# Altium schematic symbol library 724452_RPL-HX_Mobile_AEP_Rev0p91_Library.SchLib: 162 symbols (part 5 of 5)
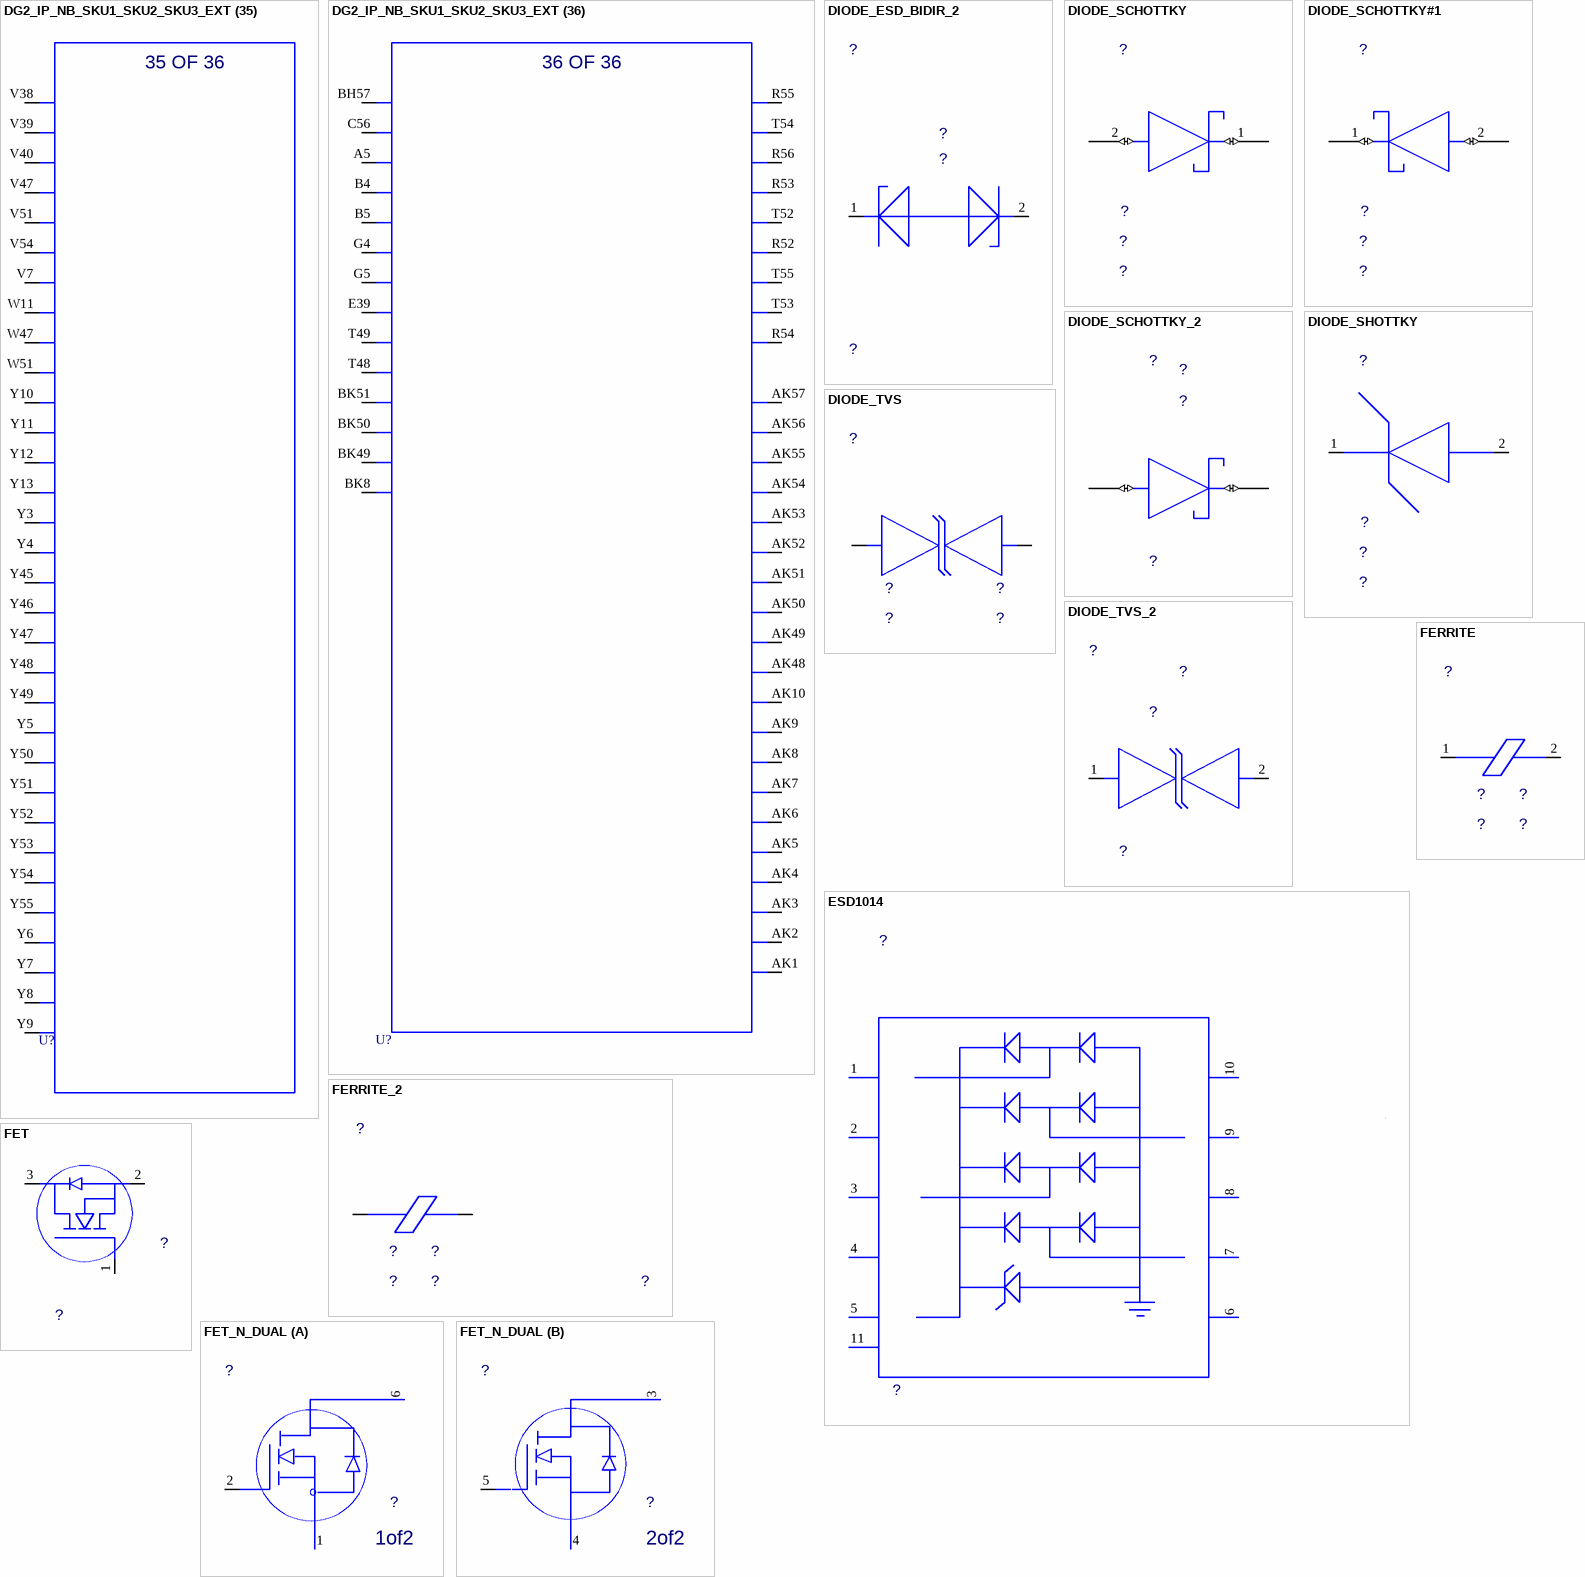
[diagram p47: symbols DG2_IP_NB_SKU1_SKU2_SKU3_EXT to FET_N_DUAL]

## DG2_IP_NB_SKU1_SKU2_SKU3_EXT (continued)
part 33 pins: D2 VSS_193 (io), D4 VSS_208 (io), D6 VSS_225 (io), D7 VSS_226 (io), D8 VSS_227 (io), D9 VSS_228 (io), D10 VSS_183 (io), D11 VSS_184 (io), D12 VSS_185 (io), D13 VSS_186 (io), D14 VSS_187 (io), D15 VSS_188 (io), D16 VSS_189 (io), D17 VSS_190 (io), D18 VSS_191 (io), D19 VSS_192 (io), D20 VSS_194 (io), D21 VSS_195 (io), D22 VSS_196 (io), D23 VSS_197 (io), D25 VSS_198 (io), D27 VSS_199 (io), D28 VSS_200 (io), D29 VSS_201 (io), D30 VSS_202 (io), D31 VSS_203 (io), D32 VSS_204 (io), D33 VSS_205 (io), D37 VSS_206 (io), D39 VSS_207 (io), D41 VSS_209 (io), D43 VSS_210 (io), D44 VSS_211 (io), D45 VSS_212 (io), D46 VSS_213 (io), D47 VSS_214 (io), D48 VSS_215 (io), D49 VSS_216 (io), D50 VSS_217 (io), D51 VSS_218 (io), D52 VSS_219 (io), D53 VSS_220 (io), D54 VSS_221 (io), D55 VSS_222 (io), D56 VSS_223 (io), D57 VSS_224 (io), E6 VSS_250 (io), E8 VSS_251 (io), E10 VSS_229 (io), E12 VSS_230 (io), E14 VSS_231 (io), E16 VSS_232 (io), E18 VSS_233 (io), E20 VSS_234 (io), E22 VSS_235 (io), E23 VSS_236 (io), E24 VSS_237 (io), E25 VSS_238 (io), E26 VSS_239 (io), E27 VSS_240 (io), E29 VSS_241 (io), E43 VSS_242 (io), E45 VSS_243 (io), E47 VSS_244 (io), E49 VSS_245 (io), E50 VSS_246 (io), E53 VSS_247 (io), E54 VSS_248 (io), E57 VSS_249 (io), F2 VSS_252 (io), F4 VSS_262 (io), F6 VSS_269 (io), F23 VSS_253 (io), F25 VSS_254 (io), F27 VSS_255 (io), F29 VSS_256 (io), F30 VSS_257 (io), F32 VSS_258 (io), F34 VSS_259 (io), F36 VSS_260 (io), F38 VSS_261 (io), F40 VSS_263 (io), F43 VSS_264 (io), F50 VSS_265 (io), F51 VSS_266 (io), F54 VSS_267 (io), F55 VSS_268 (io), G6 VSS_292 (io), G7 VSS_293 (io), G9 VSS_294 (io), G11 VSS_270 (io), G13 VSS_271 (io), G15 VSS_272 (io), G17 VSS_273 (io), G19 VSS_274 (io), G21 VSS_275 (io), G23 VSS_276 (io), G25 VSS_277 (io), G27 VSS_278 (io), G28 VSS_279 (io), G29 VSS_280 (io), G31 VSS_281 (io), G33 VSS_282 (io), G37 VSS_283 (io), G43 VSS_284 (io), G44 VSS_285 (io), G46 VSS_286 (io), G48 VSS_287 (io), G50 VSS_288 (io), G53 VSS_289 (io), G54 VSS_290 (io), G57 VSS_291 (io), H2 VSS_305 (io), H3 VSS_312 (io), H4 VSS_313 (io), H5 VSS_323 (io), H6 VSS_328 (io), H7 VSS_329 (io), H8 VSS_330 (io), H9 VSS_331 (io), H10 VSS_295 (io), H11 VSS_296 (io), H12 VSS_297 (io), H13 VSS_298 (io), H14 VSS_299 (io), H15 VSS_300 (io), H16 VSS_301 (io), H17 VSS_302 (io), H18 VSS_303 (io), H19 VSS_304 (io), H20 VSS_306 (io), H21 VSS_307 (io), H22 VSS_308 (io), H23 VSS_309 (io), H26 VSS_310 (io), H29 VSS_311 (io), H41 VSS_314 (io), H42 VSS_315 (io), H43 VSS_316 (io), H44 VSS_317 (io), H45 VSS_318 (io), H46 VSS_319 (io), H47 VSS_320 (io), H48 VSS_321 (io), H49 VSS_322 (io), H50 VSS_324 (io), H51 VSS_325 (io), H54 VSS_326 (io), H55 VSS_327 (io), J15 VSS_332 (io)
part 34 pins: J16 VSS_33 (io), J24 VSS_34 (io), J25 VSS_35 (io), J26 VSS_36 (io), J27 VSS_37 (io), J28 VSS_38 (io), J29 VSS_39 (io), J30 VSS_40 (io), J31 VSS_41 (io), J32 VSS_42 (io), J33 VSS_43 (io), J34 VSS_44 (io), J35 VSS_45 (io), J36 VSS_46 (io), J37 VSS_47 (io), J38 VSS_48 (io), J39 VSS_49 (io), J40 VSS_50 (io), J41 VSS_51 (io), J50 VSS_52 (io), J53 VSS_53 (io), J54 VSS_54 (io), J57 VSS_55 (io), K16 VSS_56 (io), K17 VSS_57 (io), K50 VSS_58 (io), K51 VSS_59 (io), K54 VSS_60 (io), K55 VSS_61 (io), L17 VSS_62 (io), L18 VSS_63 (io), L19 VSS_64 (io), L51 VSS_65 (io), L52 VSS_66 (io), L53 VSS_67 (io), L54 VSS_68 (io), L55 VSS_69 (io), L56 VSS_70 (io), L57 VSS_71 (io), M19 VSS_72 (io), M20 VSS_73 (io), M21 VSS_74 (io), M22 VSS_75 (io), M23 VSS_76 (io), M24 VSS_77 (io), M25 VSS_78 (io), M26 VSS_79 (io), M27 VSS_80 (io), M28 VSS_81 (io), M29 VSS_82 (io), M30 VSS_83 (io), M31 VSS_84 (io), M32 VSS_85 (io), M33 VSS_86 (io), M34 VSS_87 (io), M35 VSS_88 (io), M36 VSS_89 (io), M37 VSS_90 (io), M38 VSS_91 (io), M39 VSS_92 (io), M40 VSS_93 (io), M41 VSS_94 (io), M42 VSS_95 (io), M43 VSS_96 (io), M44 VSS_97 (io), M45 VSS_98 (io), M46 VSS_99 (io), M47 VSS_100 (io), N47 VSS_101 (io), P47 VSS_102 (io), P48 VSS_103 (io), P49 VSS_104 (io), P50 VSS_105 (io), P51 VSS_106 (io), P52 VSS_107 (io), P53 VSS_108 (io), P54 VSS_109 (io), P55 VSS_110 (io), P56 VSS_111 (io), P57 VSS_112 (io), R16 VSS_113 (io), R17 VSS_114 (io), R18 VSS_115 (io), R19 VSS_116 (io), R20 VSS_117 (io), R21 VSS_118 (io), R22 VSS_119 (io), R23 VSS_120 (io), R24 VSS_121 (io), R25 VSS_122 (io), R26 VSS_123 (io), R27 VSS_124 (io), R28 VSS_125 (io), R29 VSS_126 (io), R30 VSS_127 (io), R31 VSS_128 (io), R32 VSS_129 (io), R33 VSS_130 (io), R34 VSS_131 (io), R35 VSS_132 (io), R36 VSS_133 (io), R37 VSS_134 (io), R38 VSS_135 (io), R39 VSS_136 (io), R40 VSS_137 (io), R41 VSS_138 (io), R42 VSS_139 (io), R47 VSS_140 (io), T47 VSS_141 (io), T56 VSS_142 (io), U2 VSS_145 (io), U3 VSS_146 (io), U4 VSS_147 (io), U5 VSS_151 (io), U6 VSS_158 (io), U7 VSS_159 (io), U8 VSS_160 (io), U9 VSS_161 (io), U10 VSS_143 (io), U11 VSS_144 (io), U47 VSS_148 (io), U48 VSS_149 (io), U49 VSS_150 (io), U50 VSS_152 (io), U51 VSS_153 (io), U52 VSS_154 (io), U53 VSS_155 (io), U54 VSS_156 (io), U55 VSS_157 (io), V11 VSS_162 (io), V18 VSS_163 (io), V19 VSS_164 (io), V20 VSS_165 (io), V21 VSS_166 (io), V22 VSS_167 (io), V23 VSS_168 (io), V24 VSS_169 (io), V25 VSS_170 (io), V26 VSS_171 (io), V27 VSS_172 (io), V28 VSS_173 (io), V29 VSS_174 (io), V30 VSS_175 (io), V31 VSS_176 (io), V32 VSS_177 (io), V33 VSS_178 (io), V34 VSS_179 (io), V35 VSS_180 (io), V36 VSS_181 (io), V37 VSS_182 (io)
part 35 pins: V7 VSS_7 (io), V38 VSS_1 (io), V39 VSS_2 (io), V40 VSS_3 (io), V47 VSS_4 (io), V51 VSS_5 (io), V54 VSS_6 (io), W11 VSS_8 (io), W47 VSS_9 (io), W51 VSS_10 (io), Y3 VSS_15 (io), Y4 VSS_16 (io), Y5 VSS_22 (io), Y6 VSS_29 (io), Y7 VSS_30 (io), Y8 VSS_31 (io), Y9 VSS_32 (io), Y10 VSS_11 (io), Y11 VSS_12 (io), Y12 VSS_13 (io), Y13 VSS_14 (io), Y45 VSS_17 (io), Y46 VSS_18 (io), Y47 VSS_19 (io), Y48 VSS_20 (io), Y49 VSS_21 (io), Y50 VSS_23 (io), Y51 VSS_24 (io), Y52 VSS_25 (io), Y53 VSS_26 (io), Y54 VSS_27 (io), Y55 VSS_28 (io)
part 36 pins: A5 RSVD_2 (io), AK1 RSVD_22 (io), AK2 RSVD_21 (io), AK3 RSVD_20 (io), AK4 RSVD_19 (io), AK5 RSVD_18 (io), AK6 RSVD_17 (io), AK7 RSVD_16 (io), AK8 RSVD_15 (io), AK9 RSVD_14 (io), AK10 RSVD_13 (io), AK48 RSVD_12 (io), AK49 RSVD_11 (io), AK50 RSVD_10 (io), AK51 RSVD_9 (io), AK52 RSVD_8 (io), AK53 RSVD_7 (io), AK54 RSVD_6 (io), AK55 RSVD_5 (io), AK56 RSVD_4 (io), AK57 RSVD_3 (io), B4 RSVD_TP_1 (io), B5 RSVD_TP_2 (io), BH57 NCTF (io), BK8 RSVD_TP_11 (io), BK49 RSVD_TP_10 (io), BK50 RSVD_TP_9 (io), BK51 RSVD_TP_8 (io), C56 RSVD_1 (io), E39 RSVD_TP_5 (io), G4 RSVD_TP_3 (io), G5 RSVD_TP_4 (io), R52 RSVD_TP_17 (io), R53 RSVD_TP_15 (io), R54 RSVD_TP_20 (io), R55 RSVD_TP_12 (io), R56 RSVD_TP_14 (io), T48 RSVD_TP_7 (io), T49 RSVD_TP_6 (io), T52 RSVD_TP_16 (io), T53 RSVD_TP_19 (io), T54 RSVD_TP_13 (io), T55 RSVD_TP_18 (io)
part A text: 1 OF 36
part B text: 2 OF 36
part C text: 3 OF 36
part D text: 4 OF 36
part E text: 5 OF 36
part F text: 6 OF 36
part G text: 7 OF 36
part H text: 8 OF 36
part I text: 9 OF 36
part J text: 10  OF 36
part K text: 11 OF 36
part L text: 12  OF 36
part M text: 13 OF 36
part N text: 14 OF 36
part O text: 15 OF 36
part P text: 16 OF 36
part Q text: 17 OF 36
part R text: 18 OF 36
part S text: 19 OF 36
part T text: 20 OF 36
part U text: 21 OF 36
part V text: 22 OF 36
part W text: 23 OF 36
part X text: 24 OF 36
part Y text: 25 OF 36
part Z text: 26 OF 36
part 27 text: 27 OF 36
part 28 text: 28 OF 36
part 29 text: 29 OF 36
part 30 text: 30 OF 36
part 31 text: 31 OF 36
part 32 text: 32 OF 36
part 33 text: 33 OF 36
part 34 text: 34 OF 36
part 35 text: 35 OF 36
part 36 text: 36 OF 36

## DIODE_ESD_BIDIR_2
designator ?, comment ?
BOM_USE: STUFF; CDS_LMAN_SYM_OUTLINE: -150,150,150,-150; ROOM: NONE; OriginalSymbolOrigin: (-125,50); CURRENT: ?; FP_TECH: ?; IP: ?; MATERIAL: ?; PACK_TYPE: ?; PART_NUMBER: ?; VARIANT: ?
pins: 1 K1 (io), 2 K2 (io)

## DIODE_SCHOTTKY
designator ?, comment ?
CDS_LMAN_SYM_OUTLINE: -50,100,50,-100; OriginalSymbolOrigin: (-75,50); CURRENT: ?; MATERIAL: ?; PACK_TYPE: ?; PART_NUMBER: ?
pins: 1 CATHODE (io), 2 ANODE (io)

## DIODE_SCHOTTKY#1
designator ?, comment ?
CDS_LMAN_SYM_OUTLINE: -50,100,50,-100; OriginalSymbolOrigin: (-75,50); CURRENT: ?; MATERIAL: ?; PACK_TYPE: ?; PART_NUMBER: ?
pins: 1 CATHODE (io), 2 ANODE (io)

## DIODE_SCHOTTKY_2
designator ?, comment ?
BOM_USE: STUFF; CDS_LMAN_SYM_OUTLINE: -50,100,50,-100; ROOM: NONE; OriginalSymbolOrigin: (-75,50); CURRENT: ?; FP_TECH: ?; IP: ?; MATERIAL: ?; PACK_TYPE: ?; PART_NUMBER: ?; VARIANT: ?
pins: 1 CATHODE (io), 2 ANODE (io)

## DIODE_SHOTTKY
designator ?, comment ?
CDS_LMAN_SYM_OUTLINE: -50,100,50,-100; OriginalSymbolOrigin: (-125,100); CURRENT: ?; MATERIAL: ?; PACK_TYPE: ?; PART_NUMBER: ?
pins: 1 CATHODE (io), 2 ANODE (io)

## DIODE_TVS
designator ?, comment ?
CDS_LMAN_SYM_OUTLINE: -100,50,100,-50; OriginalSymbolOrigin: (-125,50); CURRENT: ?; MATERIAL: ?; PACK_TYPE: ?; PART_NUMBER: ?
pins: 1 A1 (io), 2 A2 (io)

## DIODE_TVS_2
designator ?, comment ?
BOM_USE: STUFF; CDS_LMAN_SYM_OUTLINE: -100,50,100,-50; ROOM: NONE; OriginalSymbolOrigin: (-125,50); CURRENT: ?; FP_TECH: ?; IP: ?; MATERIAL: ?; PACK_TYPE: ?; PART_NUMBER: ?; VARIANT: ?
pins: 1 A1 (io), 2 A2 (io)

## ESD1014
designator ?  (value not drawn)
CDS_LMAN_SYM_OUTLINE: -300,350,250,-250; OriginalSymbolOrigin: (-350,350); MATERIAL: ?; PACK_TYPE: ?; PART_NUMBER: ?
pins: 1 (io), 2 (io), 3 (io), 4 (io), 5 (io), 6 (io), 7 (io), 8 (io), 9 (io), 10 (io), 11 (io)

## FERRITE
designator ?, comment ?
OriginalSymbolOrigin: (-75,50); CURRENT: ?; MATERIAL: ?; PACK_TYPE: ?; PART_NUMBER: ?; TOLERANCE: ?
pins: 1 A (io), 2 B (io)

## FERRITE_2
designator ?, comment ?
BOM_USE: STUFF; CDS_LMAN_SYM_OUTLINE: -50,50,50,-50; ROOM: NONE; OriginalSymbolOrigin: (-75,50); CURRENT: ?; FP_TECH: ?; IP: ?; MATERIAL: ?; PACK_TYPE: ?; PART_NUMBER: ?; TOLERANCE: ?; VARIANT: ?
pins: 1 A (io), 2 B (io)

## FET
designator ?  (value not drawn)
CDS_LMAN_SYM_OUTLINE: -100,100,100,-100; OriginalSymbolOrigin: (-75,100); MATERIAL: ?; PACK_TYPE: ?; PART_NUMBER: ?
pins: 1 G (io), 2 S (io), 3 D (io)

## FET_N_DUAL
designator ?  (value not drawn)
CDS_LMAN_SYM_OUTLINE: -100,100,100,-100; OriginalSymbolOrigin: (-125,100); MATERIAL: ?; PACK_TYPE: ?; PART_NUMBER: ?
part A pins: 1 S1 (in), 2 G1 (io), 6 D1 (io)
part B pins: 3 D2 (io), 4 S2 (io), 5 G2 (io)
part A text: 1of2
part B text: 2of2

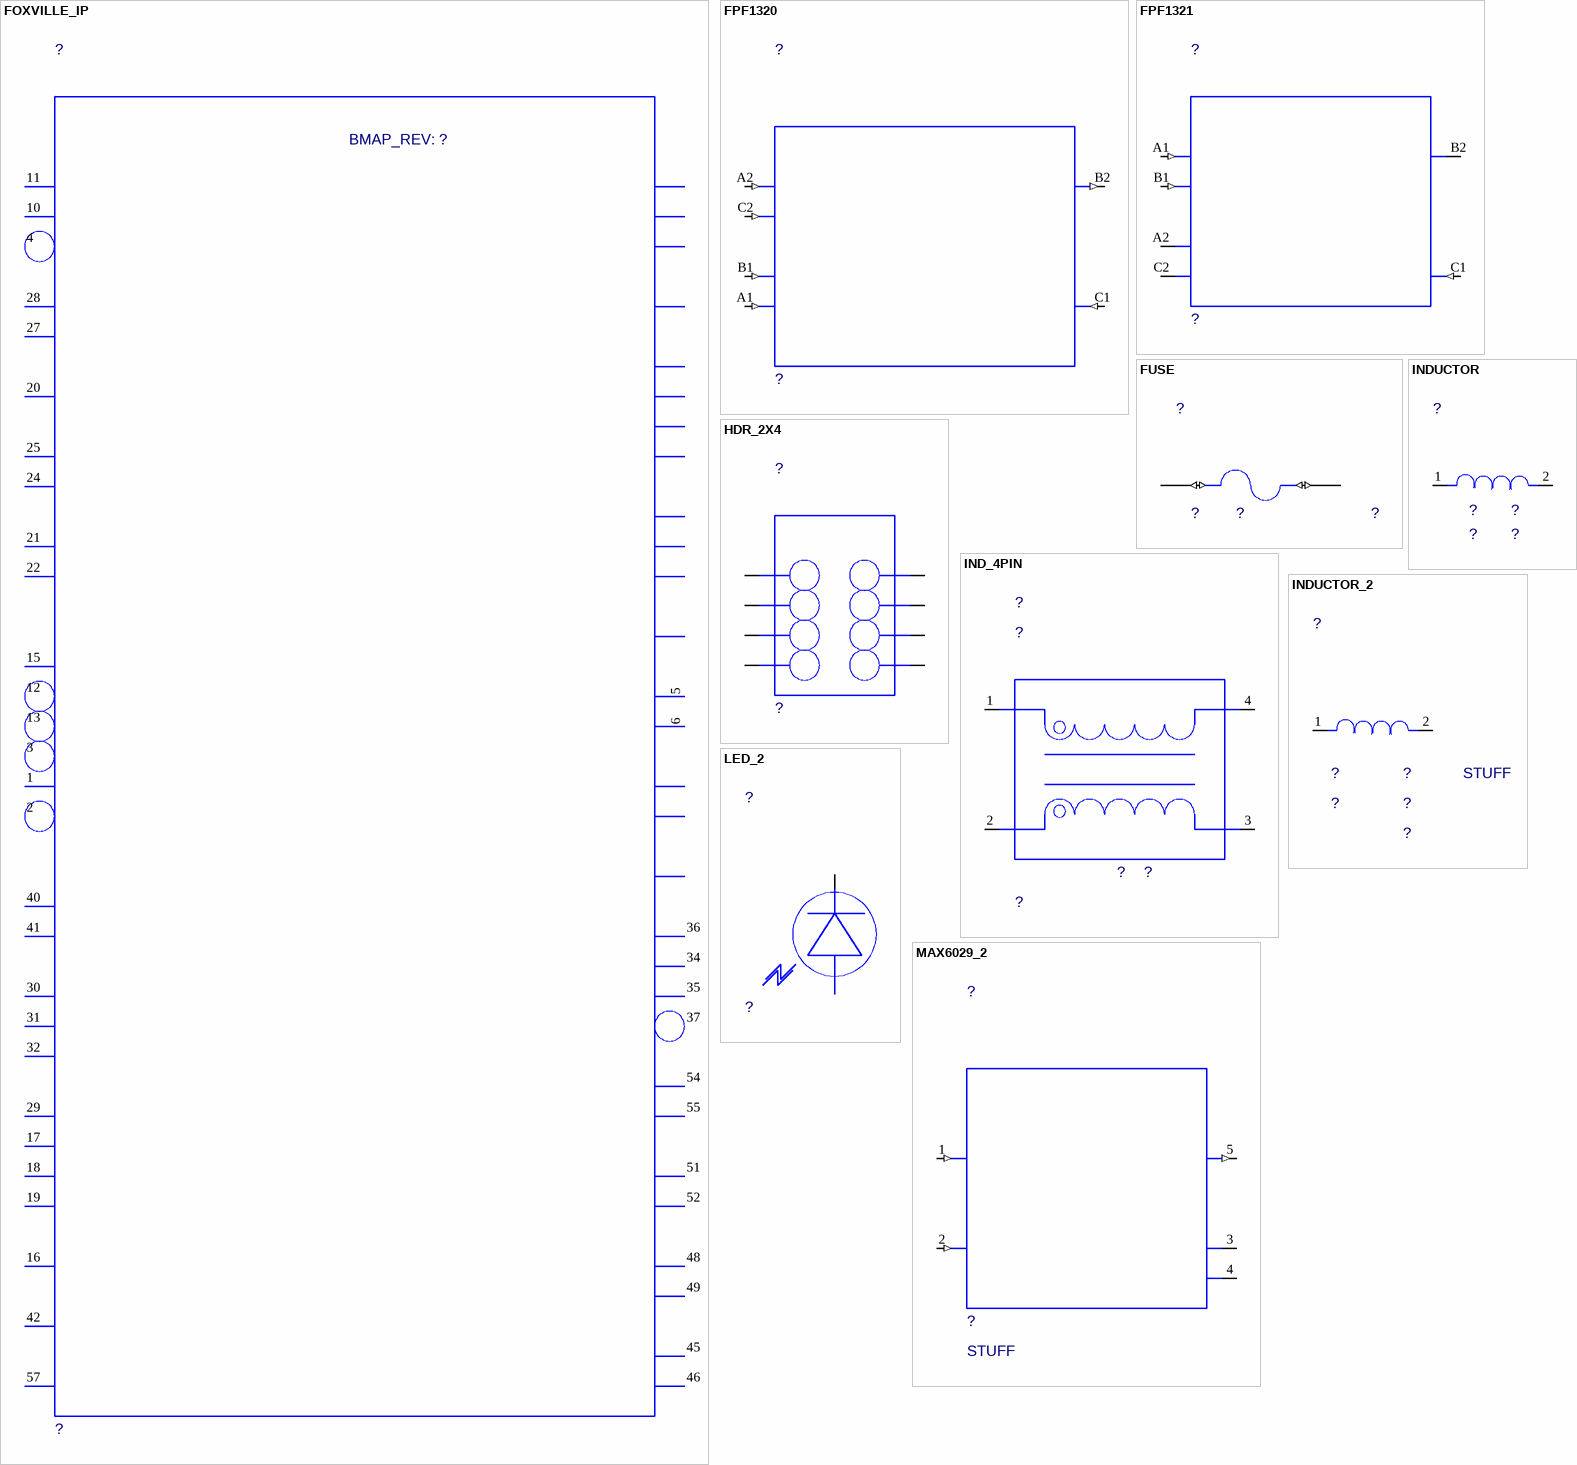
[diagram p39: symbols FOXVILLE_IP to MAX6029_2]

## FOXVILLE_IP
designator ?  (value not drawn)
CDS_LMAN_SYM_OUTLINE: -500,1100,500,-1100; OriginalSymbolOrigin: (-550,1100); BMAP_REV: ?; MATERIAL: ?; PACK_TYPE: ?; PART_NUMBER: ?
pins: 1 LAN_PWR_GOOD (in), 2 LAN_DISABLE_N (in), 3 PE_CLKREQ_N (io), 4 ULP_WAKE_N (io), 5 P0P9V_CTR_1 (out), 6 P0P9V_CTR_2 (out), 7 P3P3V_DC (power) hidden to P3P3V_DC, 8 RESERVED (power) hidden to RESERVED, 9 P0P9V_CORE_1 (power) hidden to P0P9V_CORE_1, 10 SMB_DATA (io), 11 SMB_CLK (io), 12 PE_WAKE_N (io), 13 PE_RST_N (in), 14 P3P3V_PAD_1 (power) hidden to P3P3V_PAD_1, 15 SDP0 (out), 16 JTAG_RST (in), 17 JTAG_TMS_SDP2 (in), 18 JTAG_TDO_ MDI_LANE_SWAP (out), 19 JTAG_TDI_SDP1 (in), 20 RBIAS (io), 21 PE_CLK_P (in), 22 PE_CLK_M (in), 23 P3P3V_VPH (power) hidden to P3P3V_VPH, 24 PE_TX_M (out), 25 PE_TX_P (out), 26 P0P9V_VP (power) hidden to P0P9V_VP, 27 PE_RX_M (in), 28 PE_RX_P (in), 29 JTAG_CLK (in), 30 LED2 (out), 31 LED1 (out), 32 LED0 (out), 33 P3P3V_PAD_2 (power) hidden to P3P3V_PAD_2, 34 SPI_DOUT (out), 35 SPI_CLK (out), 36 SPI_DIN_AUX_PWR (in), 37 SPI_CS_N (out), 38 P0P9V_CORE_2 (power) hidden to P0P9V_CORE_2, 39 P3P3V_XO (power) hidden to P3P3V_XO, 40 XTAL_OUT (out), 41 XTAL_IN (in), 42 PHY_CAL (io), 43 P3P3V_CDB (power) hidden to P3P3V_CDB, 44 P0P9V_A_1 (power) hidden to P0P9V_A_1, 45 MDI_A_P (io), 46 MDI_A_M (io), 47 P3P3V_A_1 (power) hidden to P3P3V_A_1, 48 MDI_B_P (io), 49 MDI_B_M (io), 50 P0P9V_A_2 (power) hidden to P0P9V_A_2, 51 MDI_C_P (io), 52 MDI_C_M (io), 53 P3P3V_A_2 (power) hidden to P3P3V_A_2, 54 MDI_D_P (io), 55 MDI_D_M (io), 56 P0P9V_A_3 (power) hidden to P0P9V_A_3, 57 THPAD (in)

## FPF1320
designator ?  (value not drawn)
CDS_LMAN_SYM_OUTLINE: -250,200,250,-200; ROOM: NONE; OriginalSymbolOrigin: (-275,200); FP_TECH: ?; IP: ?; MATERIAL: ?; PACK_TYPE: ?; PART_NUMBER: ?; VARIANT: ?
pins: A1 EN (in), A2 VINA (in), B1 SEL (in), B2 VOUT (out), C1 GND (in), C2 VINB (in)

## FPF1321
designator ?  (value not drawn)
CDS_LMAN_SYM_OUTLINE: -200,200,200,-150; OriginalSymbolOrigin: (-225,200); MATERIAL: ?; PACK_TYPE: ?; PART_NUMBER: ?
pins: A1 EN (in), A2 VIN_A (power), B1 SEL (in), B2 VOUT (power), C1 GND (in), C2 VIN_B (power)

## FUSE
designator ?  (value not drawn)
CDS_LMAN_SYM_OUTLINE: -50,25,50,-25; OriginalSymbolOrigin: (-75,25); CURRENT: ?; MATERIAL: ?; PACK_TYPE: ?; PART_NUMBER: ?; VOLTAGE: ?
pins: 1 A (io), 2 B (io)

## HDR_2X4
designator ?  (value not drawn)
CDS_LMAN_SYM_OUTLINE: -100,150,100,-150; OriginalSymbolOrigin: (-125,150); FP_TECH: ?; IP: ?; MATERIAL: ?; PACK_TYPE: ?; PART_NUMBER: ?
pins: 1 IO1 (io), 2 IO2 (io), 3 IO3 (io), 4 IO4 (io), 5 IO5 (io), 6 IO6 (io), 7 IO7 (io), 8 IO8 (io)

## IND_4PIN
designator ?, comment ?
CDS_LMAN_SYM_OUTLINE: -200,150,150,-150; OriginalSymbolOrigin: (-225,150); CURRENT: ?; MATERIAL: ?; PACK_TYPE: ?; PART_NUMBER: ?; TOLERANCE: ?
pins: 1 IN_1 (io), 2 OUT_2 (io), 3 IN_2 (io), 4 OUT_1 (io)

## INDUCTOR
designator ?, comment ?
CDS_LMAN_SYM_OUTLINE: -75,25,75,-25; OriginalSymbolOrigin: (-75,25); CURRENT: ?; MATERIAL: ?; PACK_TYPE: ?; PART_NUMBER: ?; TOLERANCE: ?
pins: 1 INA (io), 2 INB (io)

## INDUCTOR_2
designator ?, comment ?  BOM_USE: STUFF
CDS_LMAN_SYM_OUTLINE: -100,50,100,-50; ROOM: NONE; OriginalSymbolOrigin: (-75,25); CURRENT: ?; FP_TECH: ?; IP: ?; MATERIAL: ?; PACK_TYPE: ?; PART_NUMBER: ?; TOLERANCE: ?; VARIANT: ?
pins: 1 INA (io), 2 INB (io)

## LED_2
designator ?  (value not drawn)
BOM_USE: STUFF; CDS_LMAN_SYM_OUTLINE: -150,100,100,-100; ROOM: NONE; OriginalSymbolOrigin: (-125,75); FP_TECH: ?; IP: ?; MATERIAL: ?; PACK_TYPE: ?; PART_NUMBER: ?; VARIANT: ?
pins: 1 A (io), 2 C (io)

## MAX6029_2
designator ?  BOM_USE: STUFF  (hidden comment: MAX6029_2)
CDS_LMAN_SYM_OUTLINE: -200,200,200,-200; ROOM: NONE; OriginalSymbolOrigin: (-225,200); FP_TECH: ?; IP: ?; MATERIAL: ?; PACK_TYPE: ?; PART_NUMBER: ?; VARIANT: ?
pins: 1 IN (in), 2 GND (in), 3 NC1 (io), 4 NC2 (io), 5 OUT (out)

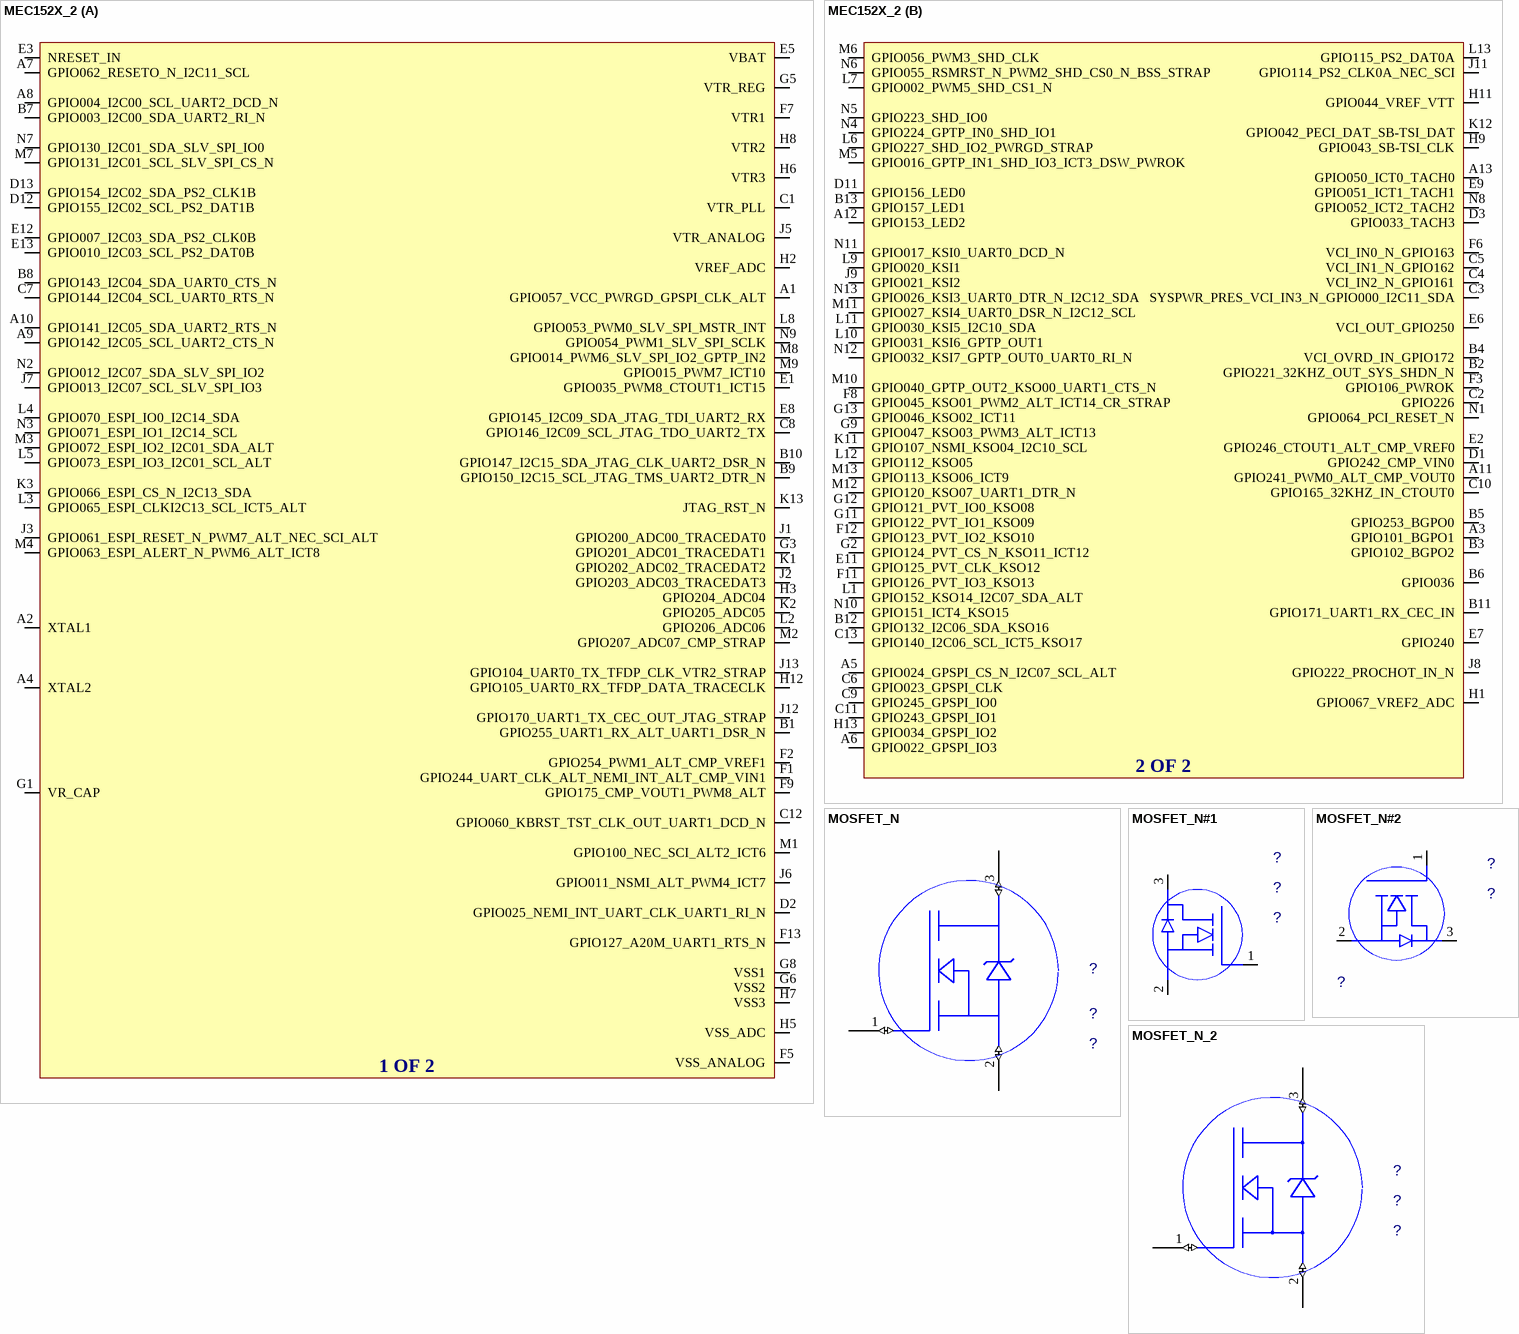
[diagram p40: symbols MEC152X_2 to MOSFET_N_2]
